# Altium schematic symbol library Sang_library.SchLib: 1607 symbols (part 10 of 15) (continued)
## PMEG4030EP,115
designator D?, comment 40V/3A
DIODE SCHOTTKY 40V 3A SOD128; MPN: PMEG4030EP,115; MFR: Nexperia USA Inc.; Solder: SMT; Value: 40V/3A; PinCount: 2
footprint SOD128 (SODFL, 2-Leads, Body 3.63x4.70mm, IPC Medium Density)
pins: 1 A, 2 K

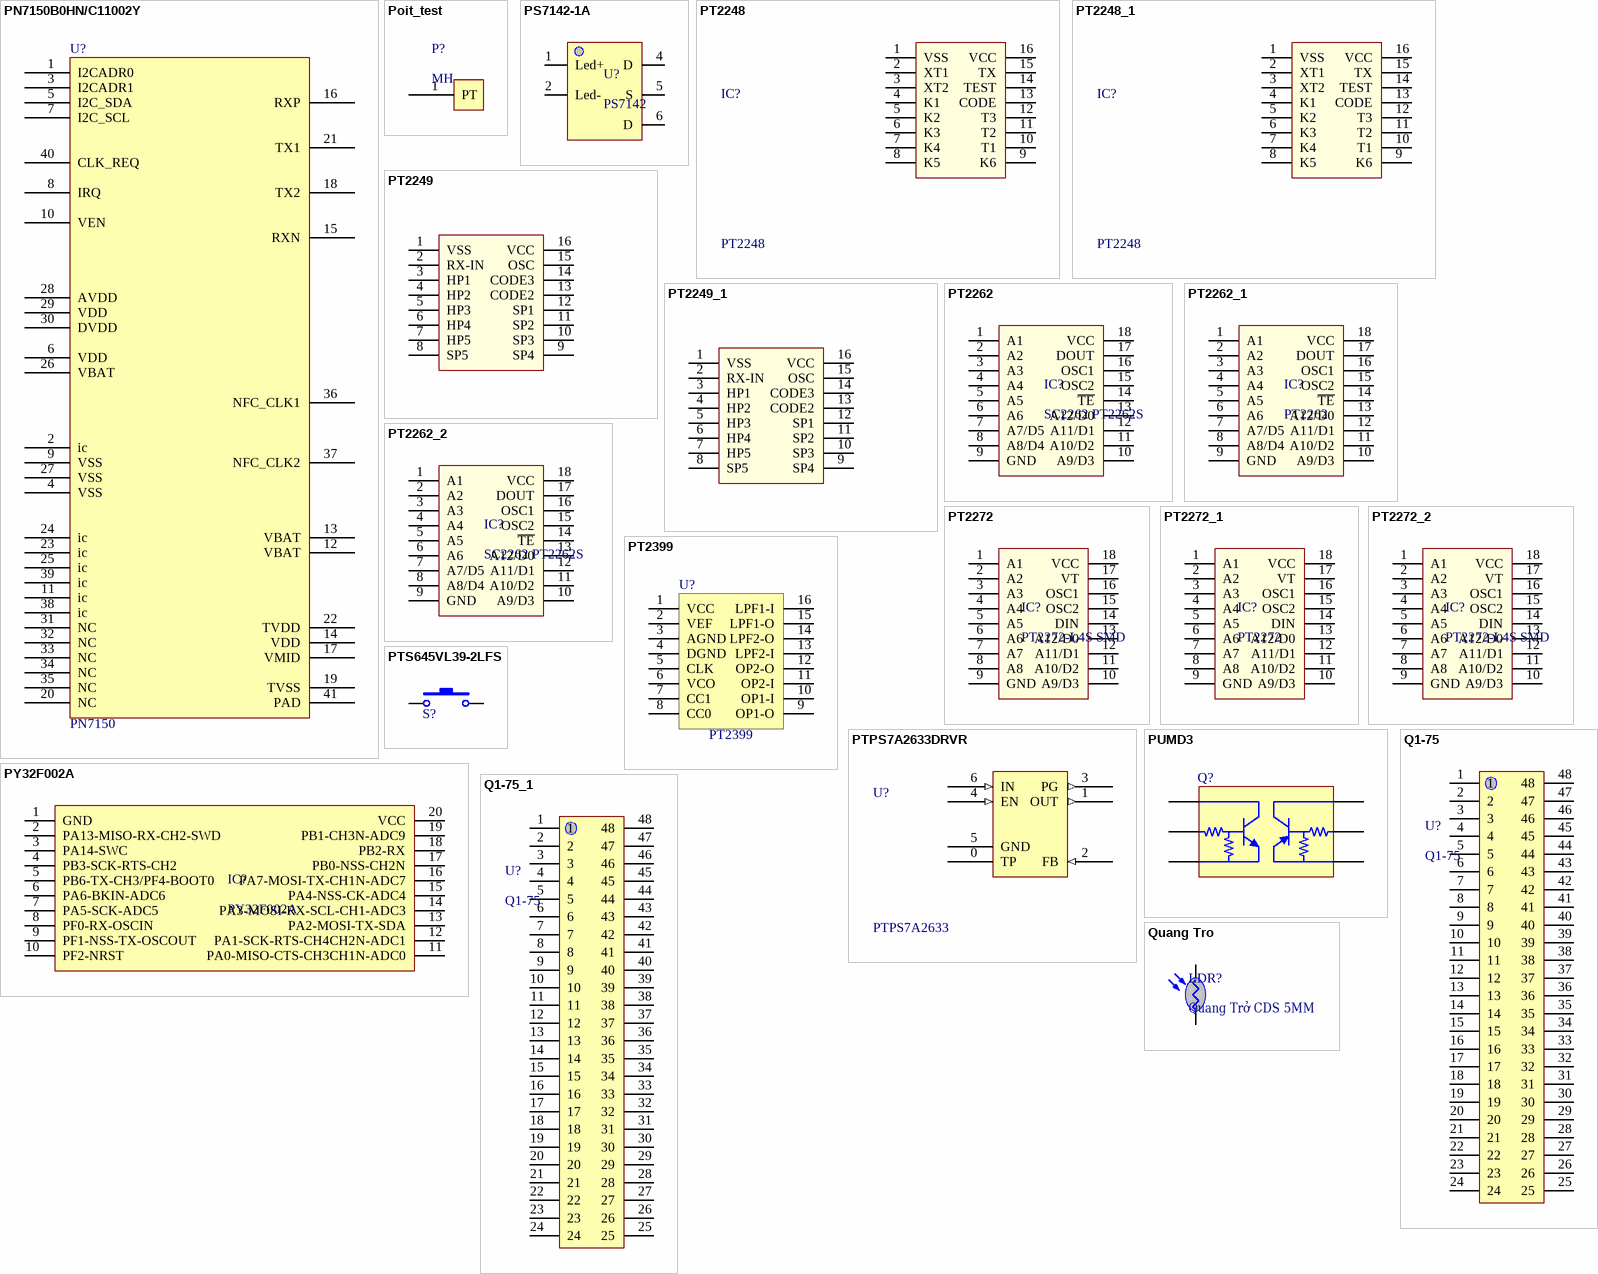
[diagram p62: symbols PN7150B0HN/C11002Y to Quang Tro]

## PN7150B0HN/C11002Y
designator U?, comment PN7150
RFID Reader IC 13.56MHz FeliCa, ISO 14443, MIFARE, NFC I²C, UART 2.3 V ~ 5.5 V 40-VFQFN Exposed Pad; MPN: PN7150B0HN/C11002Y; Solder: SMT; Value: PN7150; Category: IC
footprint VQFN-40
pins: 1 I2CADR0, 2 ic, 3 I2CADR1, 4 VSS, 5 I2C_SDA, 6 VDD, 7 I2C_SCL, 8 IRQ, 9 VSS, 10 VEN, 11 ic, 12 VBAT, 13 VBAT, 14 VDD, 15 RXN, 16 RXP, 17 VMID, 18 TX2, 19 TVSS, 20 NC, 21 TX1, 22 TVDD, 23 ic, 24 ic, 25 ic, 26 VBAT, 27 VSS, 28 AVDD, 29 VDD, 30 DVDD, 31 NC, 32 NC, 33 NC, 34 NC, 35 NC, 36 NFC_CLK1, 37 NFC_CLK2, 38 ic, 39 ic, 40 CLK_REQ, 41 PAD

## Poit_test
designator P?, comment MH
Cắm
pins: 1 PT

## PS7142-1A
designator U?, comment PS7142
footprint DIP6
pins: 1 Led+, 2 Led-, 3 NC hidden, 4 D, 5 S, 6 D

## PT2248
designator IC?
Cắm; Ten_Linh_Kien: PT2248 DIP16; Don_Vi: Con; Ma_Hang: MH002843; Ghi_Chu: *; Kieu_Chan: *; Chung_Loai: Cắm
footprint DIP16/W0.3 (16 PIN, W 300mil, Pin to pin 100mil)
pins: 1 VSS, 2 XT1, 3 XT2, 4 K1, 5 K2, 6 K3, 7 K4, 8 K5, 9 K6, 10 T1, 11 T2, 12 T3, 13 CODE, 14 TEST, 15 TX, 16 VCC

## PT2248_1
designator IC?, comment PT2248
Remote Control Tranmitter; Value: PT2248
footprint DIP16
footprint SO16L (SOIC, 16-Leads, Body 10.30x7.50mm, Pitch 1.27mm, IPC Medium Density)
pins: 1 VSS, 2 XT1, 3 XT2, 4 K1, 5 K2, 6 K3, 7 K4, 8 K5, 9 K6, 10 T1, 11 T2, 12 T3, 13 CODE, 14 TEST, 15 TX, 16 VCC

## PT2249
designator IC?, comment PT2249A
Cắm; Ten_Linh_Kien: PT2249A DIP16; Ma_Hang: MH002842; Don_Vi: Con; Ghi_Chu: *; Kieu_Chan: *; Chung_Loai: Cắm
footprint DIP16/W0.3 (16 PIN, W 300mil, Pin to pin 100mil)
pins: 1 VSS, 2 RX-IN, 3 HP1, 4 HP2, 5 HP3, 6 HP4, 7 HP5, 8 SP5, 9 SP4, 10 SP3, 11 SP2, 12 SP1, 13 CODE2, 14 CODE3, 15 OSC, 16 VCC

## PT2249_1
designator IC?, comment PT2249
Remote Control Receiver; Value: PT2249
footprint DIP16
footprint SO16L (SOIC, 16-Leads, Body 10.30x7.50mm, Pitch 1.27mm, IPC Medium Density)
pins: 1 VSS, 2 RX-IN, 3 HP1, 4 HP2, 5 HP3, 6 HP4, 7 HP5, 8 SP5, 9 SP4, 10 SP3, 11 SP2, 12 SP1, 13 CODE2, 14 CODE3, 15 OSC, 16 VCC

## PT2262
designator IC?, comment SC2262 PT2262S
Dán; Don_Vi: Con; Ma_Hang: MH000739; Ten_Linh_Kien: SC2262 PT2262S; Ghi_Chu: *; Kieu_Chan: *; Chung_Loai: Dán
footprint DIP18/W0.3 (18 PIN, W 300mil, Pin to pin 100mil)
pins: 1 A1, 2 A2, 3 A3, 4 A4, 5 A5, 6 A6, 7 A7/D5, 8 A8/D4, 9 GND, 10 A9/D3, 11 A10/D2, 12 A11/D1, 13 A12/D0, 14 ~{TE}, 15 OSC2, 16 OSC1, 17 DOUT, 18 VCC

## PT2262_1
designator IC?, comment PT2262
Remote Control Encoder
footprint DIP18 (DIP; 18 Leads; Row Spacing 7.62 mm; Pitch 2.54 mm)
footprint SO18 (SOIC, 18-Leads, Body 11.50x7.50mm, Pitch 1.27mm, IPC Medium Density)
pins: 1 A1, 2 A2, 3 A3, 4 A4, 5 A5, 6 A6, 7 A7/D5, 8 A8/D4, 9 GND, 10 A9/D3, 11 A10/D2, 12 A11/D1, 13 A12/D0, 14 ~{TE}, 15 OSC2, 16 OSC1, 17 DOUT, 18 VCC

## PT2262_2
designator IC?, comment SC2262 PT2262S
Dán; Don_Vi: Con; Ma_Hang: MH000739; Ten_Linh_Kien: SC2262 PT2262S; Ghi_Chu: *; Kieu_Chan: *; Chung_Loai: Dán
footprint DIP18/W0.3 (18 PIN, W 300mil, Pin to pin 100mil)
pins: 1 A1, 2 A2, 3 A3, 4 A4, 5 A5, 6 A6, 7 A7/D5, 8 A8/D4, 9 GND, 10 A9/D3, 11 A10/D2, 12 A11/D1, 13 A12/D0, 14 ~{TE}, 15 OSC2, 16 OSC1, 17 DOUT, 18 VCC

## PT2272
designator IC?, comment PT2272-L4S SMD
Dán; Don_Vi: Con; Ma_Hang: MH000736; Ten_Linh_Kien: PT2272-L4S SMD; Kieu _Chan: *; Ghi_Chu: *; Chung_Loai: Dán
footprint DIP18/W0.3 (18 PIN, W 300mil, Pin to pin 100mil)
pins: 1 A1, 2 A2, 3 A3, 4 A4, 5 A5, 6 A6, 7 A7, 8 A8, 9 GND, 10 A9/D3, 11 A10/D2, 12 A11/D1, 13 A12/D0, 14 DIN, 15 OSC2, 16 OSC1, 17 VT, 18 VCC

## PT2272_1
designator IC?, comment PT2272
Remote Control Decoder
footprint DIP18 (DIP; 18 Leads; Row Spacing 7.62 mm; Pitch 2.54 mm)
footprint SO18 (SOIC, 18-Leads, Body 11.50x7.50mm, Pitch 1.27mm, IPC Medium Density)
pins: 1 A1, 2 A2, 3 A3, 4 A4, 5 A5, 6 A6, 7 A7, 8 A8, 9 GND, 10 A9/D3, 11 A10/D2, 12 A11/D1, 13 A12/D0, 14 DIN, 15 OSC2, 16 OSC1, 17 VT, 18 VCC

## PT2272_2
designator IC?, comment PT2272-L4S SMD
Dán; Don_Vi: Con; Ma_Hang: MH000736; Ten_Linh_Kien: PT2272-L4S SMD; Kieu _Chan: *; Ghi_Chu: *; Chung_Loai: Dán
footprint DIP18/W0.3 (18 PIN, W 300mil, Pin to pin 100mil)
pins: 1 A1, 2 A2, 3 A3, 4 A4, 5 A5, 6 A6, 7 A7, 8 A8, 9 GND, 10 A9/D3, 11 A10/D2, 12 A11/D1, 13 A12/D0, 14 DIN, 15 OSC2, 16 OSC1, 17 VT, 18 VCC

## PT2399
designator U?
Reverb
footprint DIP16
footprint SO16L (SOIC, 16-Leads, Body 10.30x7.50mm, Pitch 1.27mm, IPC Medium Density)
pins: 1 VCC, 2 VEF, 3 AGND, 4 DGND, 5 CLK, 6 VCO, 7 CC1, 8 CC0, 9 OP1-O, 10 OP1-I, 11 OP2-I, 12 OP2-O, 13 LPF2-I, 14 LPF2-O, 15 LPF1-O, 16 LPF1-I

## PTPS7A2633DRVR
designator U?, comment PTPS7A2633
TPS7A26 500-mA, 18-V, ultra-low IQ, LDO 3.3V; MPN: PTPS7A2633DRVR; MFR: Texas Instruments; Solder: SMT; Value: PTPS7A2633; Category: IC; PinCount: 7
footprint WSON6-2x2 (Footprint not found)
pins: 0 TP, 1 OUT (out), 2 FB (in), 3 PG (out), 4 EN (in), 5 GND (power), 6 IN (in)

## PTS645VL39-2LFS
designator S?, comment SW  (value not drawn)
Switch; Value: BUTTON2; Solder: HAND
footprint PTS645VL39-2LFS (Length 7mm)
pins: 1, 2

## PUMD3
designator Q?
NPN/PNP Resistor-equipped Transistor; Published: 17-Sep-2003; LatestRevisionDate: 12-Dec-2006; LatestRevisionNote: IPC-7351 Footprint Added.; DatasheetVersion: 16-Feb-2001; PackageVersion: Feb-1997; PackageReference: SOT363; Publisher: Altium Limited; PackageDescription: 6-Pin SOT-363 Package 0.65 mm Pitch, 2.1 mm Lead Span; Code_JEITA: SC-88; Code_JEDEC: MO-203-AB; Code_IPC: SOT363-6; ComponentLink1Description: Manufacturer Link; ComponentLink1URL: http://www.semiconductors.philips.com/; ComponentLink2Description: Datasheet; ComponentLink2URL: http://www.semiconductors.philips.com/acrobat/datasheets/PEMD3_PIMD3_PUMD3_9.pdf
footprint SOT363 (SOT363, 6-Leads, Body 2x1.3mm, Pitch 0.65mm, Lead Span 2.1mm, IPC High Density)
pins: 1 E1, 2 B1, 3 C2, 4 E2, 5 B2, 6 C1

## PY32F002A
designator IC?
footprint TSSOP20 (TSSOP, 20-Leads, Body 6.50x4.40mm, Pitch 0.65mm, IPC High Density)
pins: 1 GND, 2 PA13-MISO-RX-CH2-SWD, 3 PA14-SWC, 4 PB3-SCK-RTS-CH2, 5 PB6-TX-CH3/PF4-BOOT0, 6 PA6-BKIN-ADC6, 7 PA5-SCK-ADC5, 8 PF0-RX-OSCIN, 9 PF1-NSS-TX-OSCOUT, 10 PF2-NRST, 11 PA0-MISO-CTS-CH3CH1N-ADC0, 12 PA1-SCK-RTS-CH4CH2N-ADC1, 13 PA2-MOSI-TX-SDA, 14 PA3-MOSI-RX-SCL-CH1-ADC3, 15 PA4-NSS-CK-ADC4, 16 PA7-MOSI-TX-CH1N-ADC7, 17 PB0-NSS-CH2N, 18 PB2-RX, 19 PB1-CH3N-ADC9, 20 VCC

## Q1-75
designator U?
pins: 1, 2, 3, 4, 5, 6, 7, 8, 9, 10, 11, 12, 13, 14, 15, 16, 17, 18, 19, 20, 21, 22, 23, 24, 25, 26, 27, 28, 29, 30, 31, 32, 33, 34, 35, 36, 37, 38, 39, 40, 41, 42, 43, 44, 45, 46, 47, 48

## Q1-75_1
designator U?, comment Q1-75
pins: 1, 2, 3, 4, 5, 6, 7, 8, 9, 10, 11, 12, 13, 14, 15, 16, 17, 18, 19, 20, 21, 22, 23, 24, 25, 26, 27, 28, 29, 30, 31, 32, 33, 34, 35, 36, 37, 38, 39, 40, 41, 42, 43, 44, 45, 46, 47, 48

## Quang Tro
designator LDR?, comment Quang Trở CDS 5MM
Cắm; Ten_Linh_Kien: Quang Trở CDS 5MM 5537; Don_Vi: Con; Ma_Hang: MH000544; Ghi_Chu: *; Kieu_Chan: *; Chung_Loai: Cắm
footprint CDS (Footprint not found)
pins: 1 A, 2 K

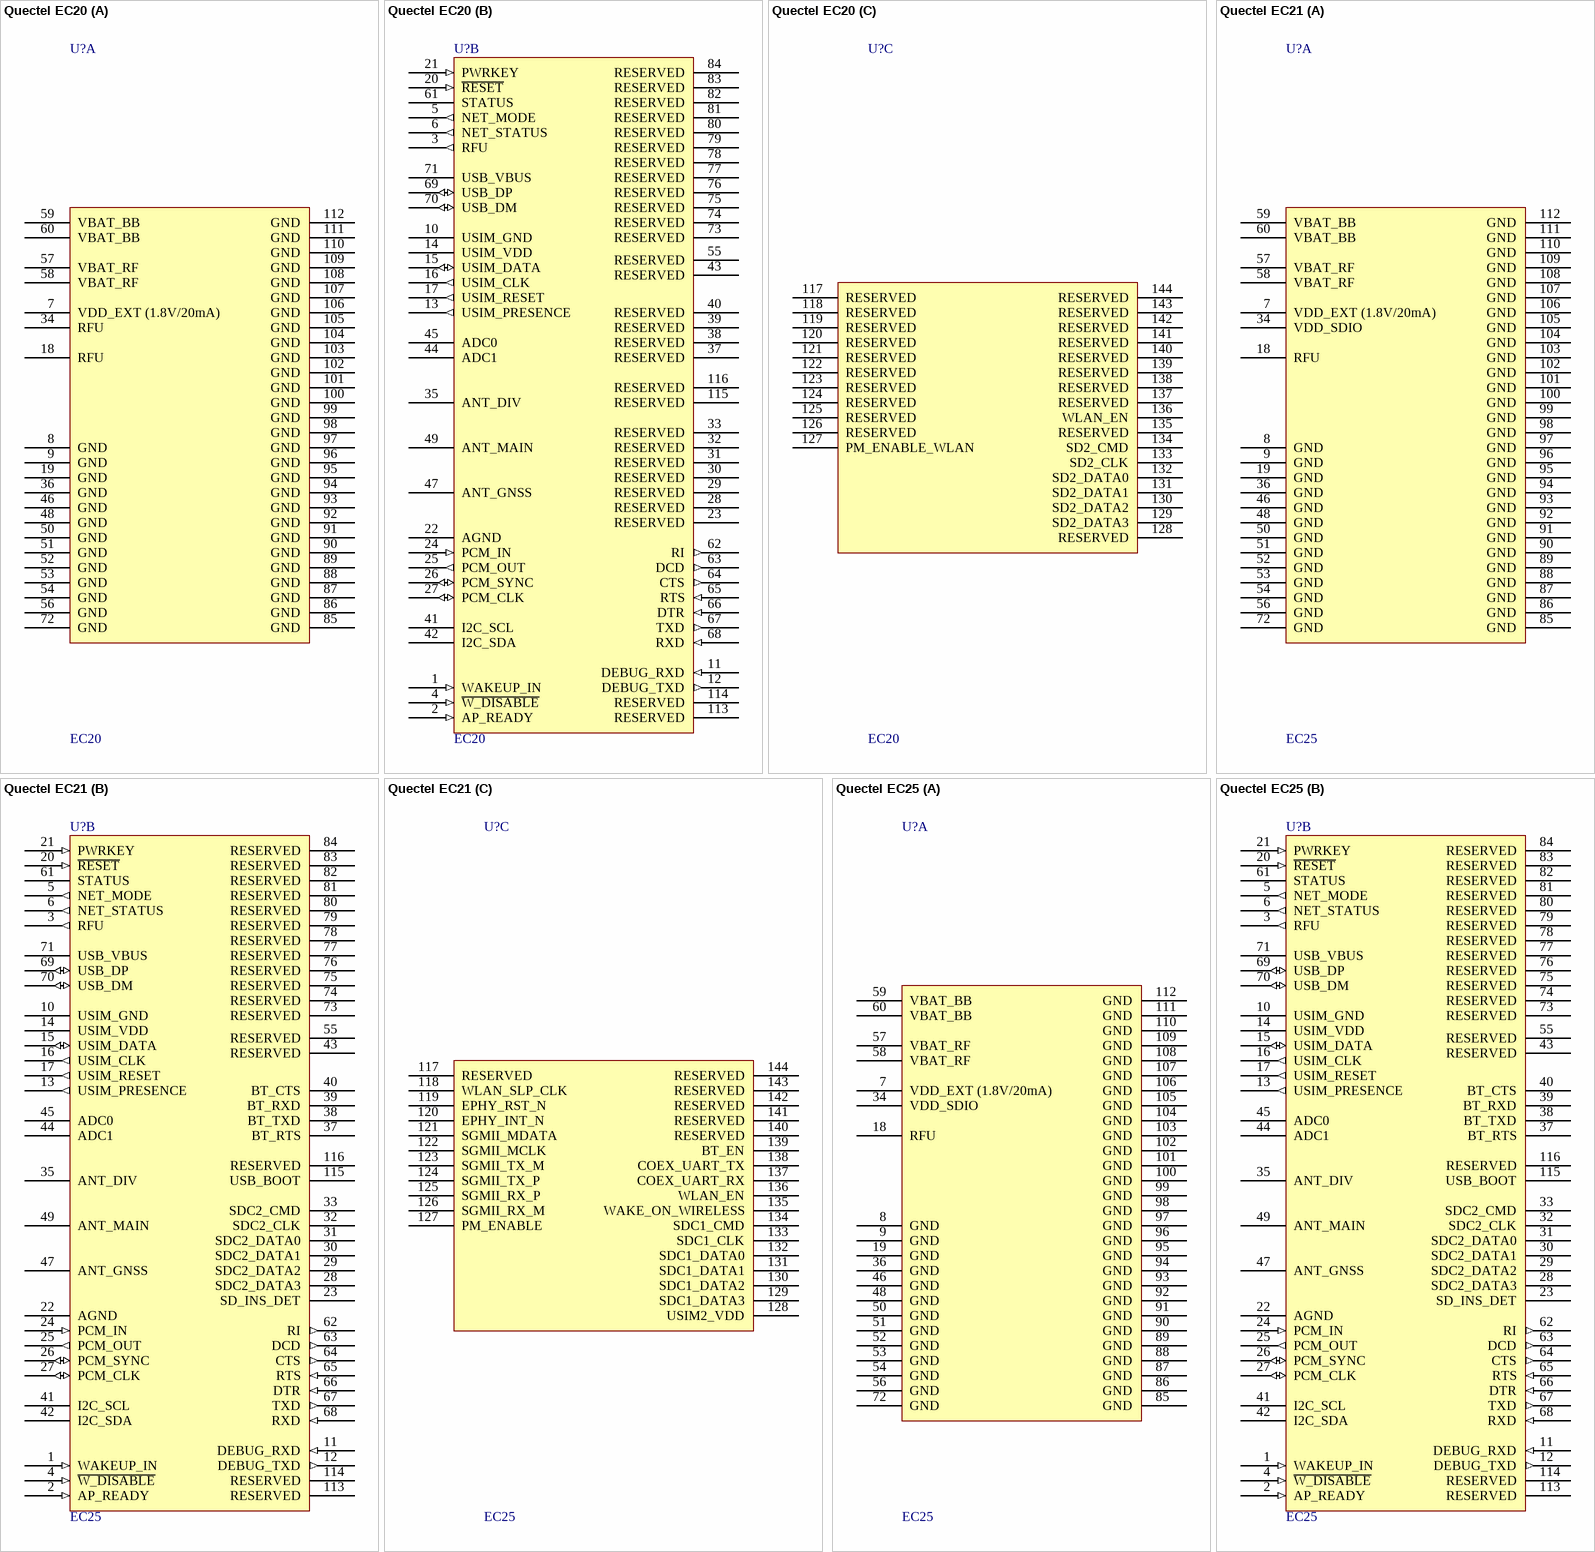
[diagram p63: symbols Quectel EC20 to Quectel EC25]

## Quectel EC20
designator U?, comment EC20
Value: EC20A; Solder: SMT; MPN: EC20A; Category: MODULE
footprint QUECTEL_EC25
part A pins: 7 VDD_EXT (1.8V/20mA) (power), 8 GND (power), 9 GND (power), 18 RFU (power), 19 GND (power), 34 RFU (power), 36 GND (power), 46 GND (power), 48 GND (power), 50 GND (power), 51 GND (power), 52 GND (power), 53 GND (power), 54 GND (power), 56 GND (power), 57 VBAT_RF (power), 58 VBAT_RF (power), 59 VBAT_BB (power), 60 VBAT_BB (power), 72 GND (power), 85 GND (power), 86 GND (power), 87 GND (power), 88 GND (power), 89 GND (power), 90 GND (power), 91 GND (power), 92 GND (power), 93 GND (power), 94 GND (power), 95 GND (power), 96 GND (power), 97 GND (power), 98 GND (power), 99 GND (power), 100 GND (power), 101 GND (power), 102 GND (power), 103 GND (power), 104 GND (power), 105 GND (power), 106 GND (power), 107 GND (power), 108 GND (power), 109 GND (power), 110 GND (power), 111 GND (power), 112 GND (power)
part B pins: 1 WAKEUP_IN (in), 2 AP_READY (in), 3 RFU (out), 4 ~{W_DISABLE} (in), 5 NET_MODE (out), 6 NET_STATUS (out), 10 USIM_GND (power), 11 DEBUG_RXD (in), 12 DEBUG_TXD (out), 13 USIM_PRESENCE (out), 14 USIM_VDD (power), 15 USIM_DATA (io), 16 USIM_CLK (out), 17 USIM_RESET (out), 20 ~{RESET} (in), 21 PWRKEY (in), 22 AGND (power), 23 RESERVED, 24 PCM_IN (in), 25 PCM_OUT (out), 26 PCM_SYNC (io), 27 PCM_CLK (io), 28 RESERVED, 29 RESERVED, 30 RESERVED, 31 RESERVED, 32 RESERVED, 33 RESERVED, 35 ANT_DIV, 37 RESERVED, 38 RESERVED, 39 RESERVED, 40 RESERVED, 41 I2C_SCL (oe), 42 I2C_SDA (oe), 43 RESERVED, 44 ADC1 (hiz) "0.2V-4.2V", 45 ADC0 (hiz) "0.2V-2.1V", 47 ANT_GNSS, 49 ANT_MAIN, 55 RESERVED, 61 STATUS (oe), 62 RI (out), 63 DCD (out), 64 CTS (out), 65 RTS (in), 66 DTR (in), 67 TXD (out), 68 RXD (in), 69 USB_DP (io), 70 USB_DM (io), 71 USB_VBUS (power), 73 RESERVED, 74 RESERVED, 75 RESERVED, 76 RESERVED, 77 RESERVED, 78 RESERVED, 79 RESERVED, 80 RESERVED, 81 RESERVED, 82 RESERVED, 83 RESERVED, 84 RESERVED, 113 RESERVED, 114 RESERVED, 115 RESERVED, 116 RESERVED
part C pins: 117 RESERVED, 118 RESERVED, 119 RESERVED, 120 RESERVED, 121 RESERVED, 122 RESERVED, 123 RESERVED, 124 RESERVED, 125 RESERVED, 126 RESERVED, 127 PM_ENABLE_WLAN, 128 RESERVED, 129 SD2_DATA3, 130 SD2_DATA2, 131 SD2_DATA1, 132 SD2_DATA0, 133 SD2_CLK, 134 SD2_CMD, 135 RESERVED, 136 WLAN_EN, 137 RESERVED, 138 RESERVED, 139 RESERVED, 140 RESERVED, 141 RESERVED, 142 RESERVED, 143 RESERVED, 144 RESERVED

## Quectel EC21
designator U?, comment EC25
MFR: Quectel; Value: EC21; Solder: SMT; MPN: EC21; Category: MODULE
footprint QUECTEL_EC21
part A pins: 7 VDD_EXT (1.8V/20mA) (power), 8 GND (power), 9 GND (power), 18 RFU (power), 19 GND (power), 34 VDD_SDIO (power), 36 GND (power), 46 GND (power), 48 GND (power), 50 GND (power), 51 GND (power), 52 GND (power), 53 GND (power), 54 GND (power), 56 GND (power), 57 VBAT_RF (power), 58 VBAT_RF (power), 59 VBAT_BB (power), 60 VBAT_BB (power), 72 GND (power), 85 GND (power), 86 GND (power), 87 GND (power), 88 GND (power), 89 GND (power), 90 GND (power), 91 GND (power), 92 GND (power), 93 GND (power), 94 GND (power), 95 GND (power), 96 GND (power), 97 GND (power), 98 GND (power), 99 GND (power), 100 GND (power), 101 GND (power), 102 GND (power), 103 GND (power), 104 GND (power), 105 GND (power), 106 GND (power), 107 GND (power), 108 GND (power), 109 GND (power), 110 GND (power), 111 GND (power), 112 GND (power)
part B pins: 1 WAKEUP_IN (in), 2 AP_READY (in), 3 RFU (out), 4 ~{W_DISABLE} (in), 5 NET_MODE (out), 6 NET_STATUS (out), 10 USIM_GND (power), 11 DEBUG_RXD (in), 12 DEBUG_TXD (out), 13 USIM_PRESENCE (out), 14 USIM_VDD (power), 15 USIM_DATA (io), 16 USIM_CLK (out), 17 USIM_RESET (out), 20 ~{RESET} (in), 21 PWRKEY (in), 22 AGND (power), 23 SD_INS_DET, 24 PCM_IN (in), 25 PCM_OUT (out), 26 PCM_SYNC (io), 27 PCM_CLK (io), 28 SDC2_DATA3, 29 SDC2_DATA2, 30 SDC2_DATA1, 31 SDC2_DATA0, 32 SDC2_CLK, 33 SDC2_CMD, 35 ANT_DIV, 37 BT_RTS, 38 BT_TXD, 39 BT_RXD, 40 BT_CTS, 41 I2C_SCL (oe), 42 I2C_SDA (oe), 43 RESERVED, 44 ADC1 (hiz) "0.2V-4.2V", 45 ADC0 (hiz) "0.2V-2.1V", 47 ANT_GNSS, 49 ANT_MAIN, 55 RESERVED, 61 STATUS (oe), 62 RI (out), 63 DCD (out), 64 CTS (out), 65 RTS (in), 66 DTR (in), 67 TXD (out), 68 RXD (in), 69 USB_DP (io), 70 USB_DM (io), 71 USB_VBUS (power), 73 RESERVED, 74 RESERVED, 75 RESERVED, 76 RESERVED, 77 RESERVED, 78 RESERVED, 79 RESERVED, 80 RESERVED, 81 RESERVED, 82 RESERVED, 83 RESERVED, 84 RESERVED, 113 RESERVED, 114 RESERVED, 115 USB_BOOT, 116 RESERVED
part C pins: 117 RESERVED, 118 WLAN_SLP_CLK, 119 EPHY_RST_N, 120 EPHY_INT_N, 121 SGMII_MDATA, 122 SGMII_MCLK, 123 SGMII_TX_M, 124 SGMII_TX_P, 125 SGMII_RX_P, 126 SGMII_RX_M, 127 PM_ENABLE, 128 USIM2_VDD, 129 SDC1_DATA3, 130 SDC1_DATA2, 131 SDC1_DATA1, 132 SDC1_DATA0, 133 SDC1_CLK, 134 SDC1_CMD, 135 WAKE_ON_WIRELESS, 136 WLAN_EN, 137 COEX_UART_RX, 138 COEX_UART_TX, 139 BT_EN, 140 RESERVED, 141 RESERVED, 142 RESERVED, 143 RESERVED, 144 RESERVED

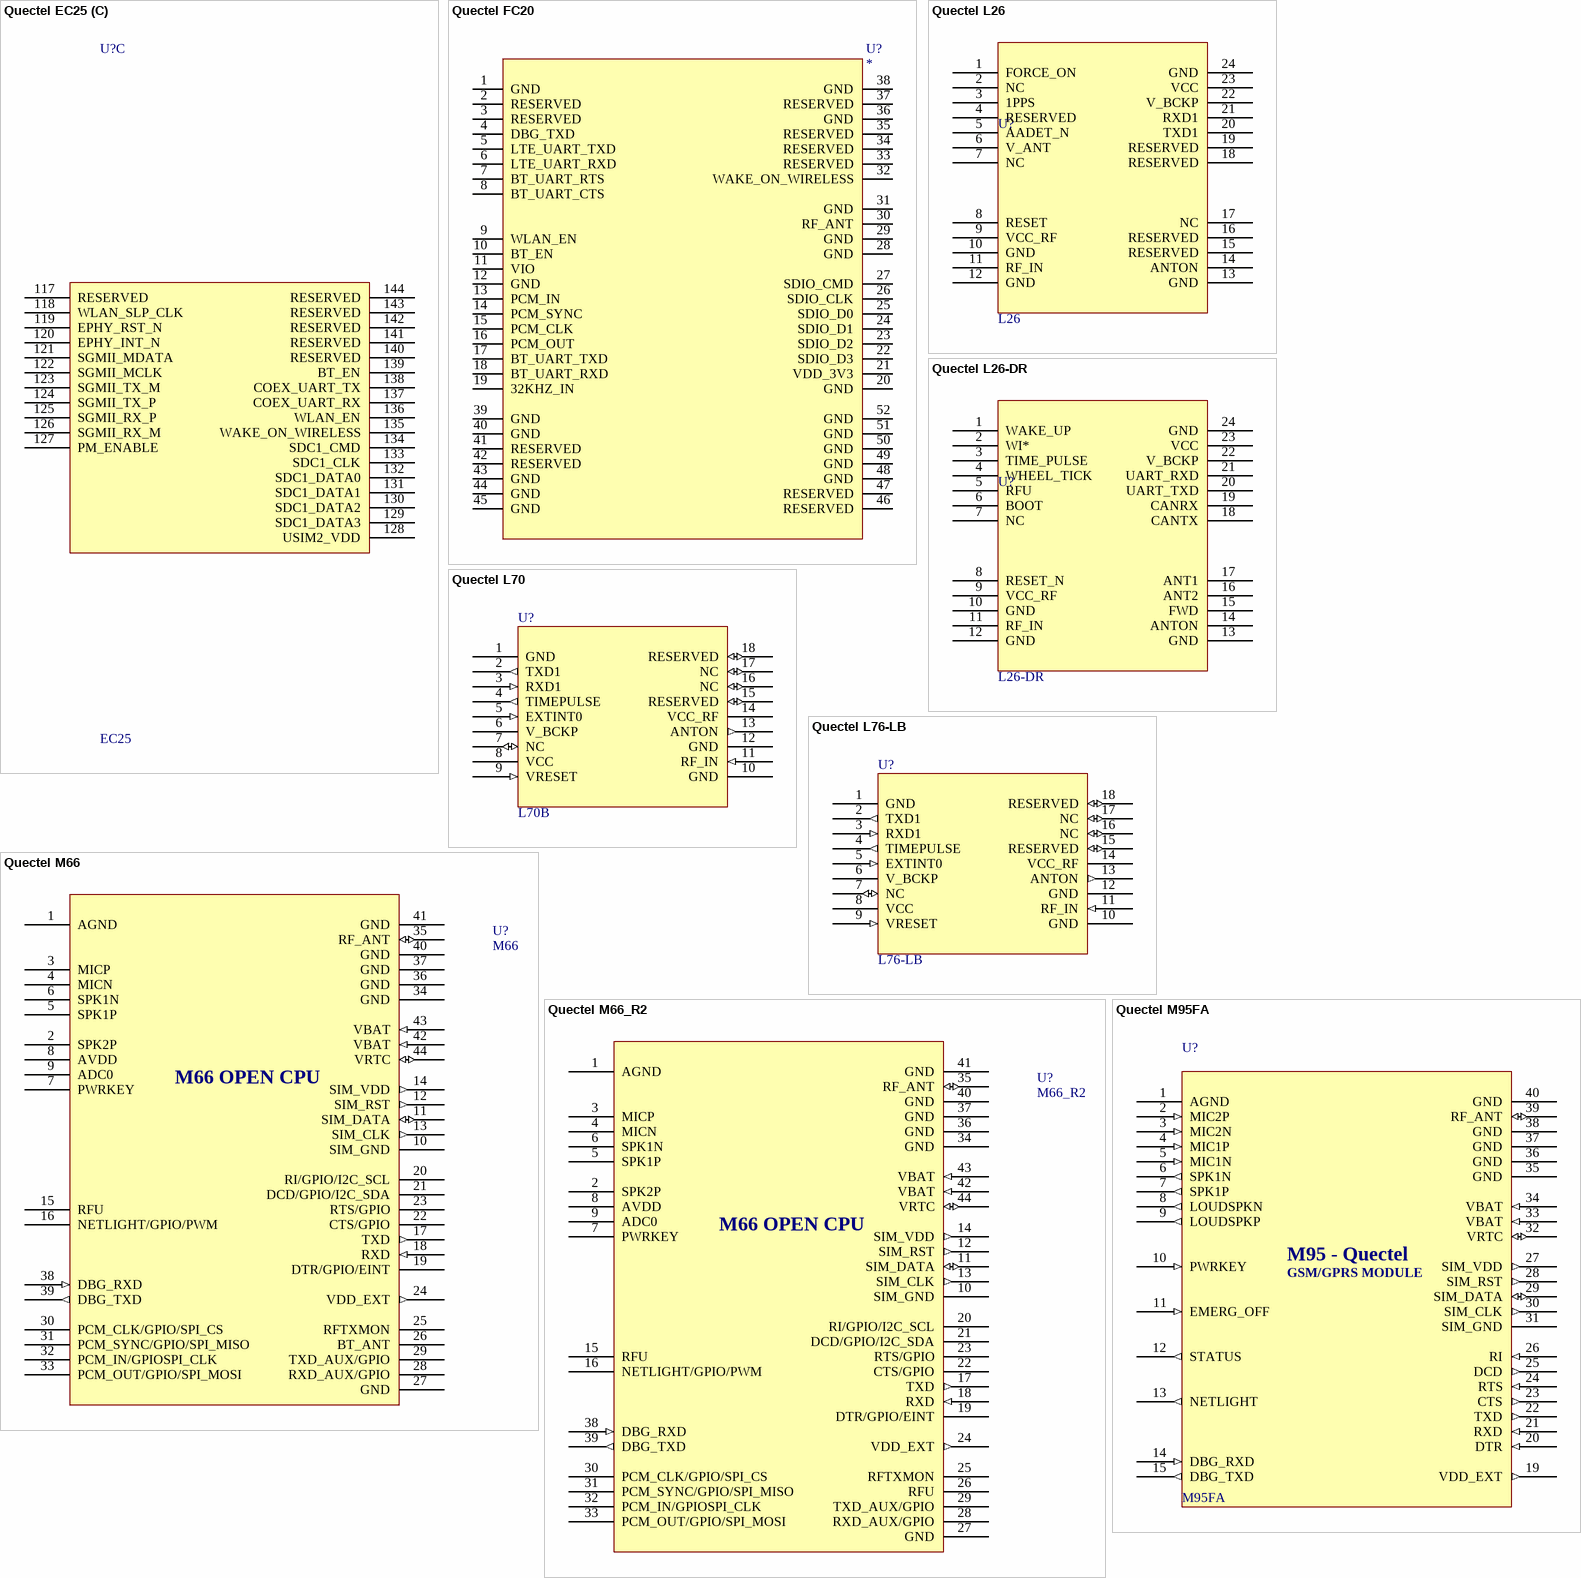
[diagram p64: symbols Quectel EC25 to Quectel M95FA]

## Quectel EC25
designator U?, comment EC25
MFR: Quectel; Value: EC25A; Solder: SMT; MPN: EC25A; Category: MODULE
footprint QUECTEL_EC25
part A pins: 7 VDD_EXT (1.8V/20mA) (power), 8 GND (power), 9 GND (power), 18 RFU (power), 19 GND (power), 34 VDD_SDIO (power), 36 GND (power), 46 GND (power), 48 GND (power), 50 GND (power), 51 GND (power), 52 GND (power), 53 GND (power), 54 GND (power), 56 GND (power), 57 VBAT_RF (power), 58 VBAT_RF (power), 59 VBAT_BB (power), 60 VBAT_BB (power), 72 GND (power), 85 GND (power), 86 GND (power), 87 GND (power), 88 GND (power), 89 GND (power), 90 GND (power), 91 GND (power), 92 GND (power), 93 GND (power), 94 GND (power), 95 GND (power), 96 GND (power), 97 GND (power), 98 GND (power), 99 GND (power), 100 GND (power), 101 GND (power), 102 GND (power), 103 GND (power), 104 GND (power), 105 GND (power), 106 GND (power), 107 GND (power), 108 GND (power), 109 GND (power), 110 GND (power), 111 GND (power), 112 GND (power)
part B pins: 1 WAKEUP_IN (in), 2 AP_READY (in), 3 RFU (out), 4 ~{W_DISABLE} (in), 5 NET_MODE (out), 6 NET_STATUS (out), 10 USIM_GND (power), 11 DEBUG_RXD (in), 12 DEBUG_TXD (out), 13 USIM_PRESENCE (out), 14 USIM_VDD (power), 15 USIM_DATA (io), 16 USIM_CLK (out), 17 USIM_RESET (out), 20 ~{RESET} (in), 21 PWRKEY (in), 22 AGND (power), 23 SD_INS_DET, 24 PCM_IN (in), 25 PCM_OUT (out), 26 PCM_SYNC (io), 27 PCM_CLK (io), 28 SDC2_DATA3, 29 SDC2_DATA2, 30 SDC2_DATA1, 31 SDC2_DATA0, 32 SDC2_CLK, 33 SDC2_CMD, 35 ANT_DIV, 37 BT_RTS, 38 BT_TXD, 39 BT_RXD, 40 BT_CTS, 41 I2C_SCL (oe), 42 I2C_SDA (oe), 43 RESERVED, 44 ADC1 (hiz) "0.2V-4.2V", 45 ADC0 (hiz) "0.2V-2.1V", 47 ANT_GNSS, 49 ANT_MAIN, 55 RESERVED, 61 STATUS (oe), 62 RI (out), 63 DCD (out), 64 CTS (out), 65 RTS (in), 66 DTR (in), 67 TXD (out), 68 RXD (in), 69 USB_DP (io), 70 USB_DM (io), 71 USB_VBUS (power), 73 RESERVED, 74 RESERVED, 75 RESERVED, 76 RESERVED, 77 RESERVED, 78 RESERVED, 79 RESERVED, 80 RESERVED, 81 RESERVED, 82 RESERVED, 83 RESERVED, 84 RESERVED, 113 RESERVED, 114 RESERVED, 115 USB_BOOT, 116 RESERVED
part C pins: 117 RESERVED, 118 WLAN_SLP_CLK, 119 EPHY_RST_N, 120 EPHY_INT_N, 121 SGMII_MDATA, 122 SGMII_MCLK, 123 SGMII_TX_M, 124 SGMII_TX_P, 125 SGMII_RX_P, 126 SGMII_RX_M, 127 PM_ENABLE, 128 USIM2_VDD, 129 SDC1_DATA3, 130 SDC1_DATA2, 131 SDC1_DATA1, 132 SDC1_DATA0, 133 SDC1_CLK, 134 SDC1_CMD, 135 WAKE_ON_WIRELESS, 136 WLAN_EN, 137 COEX_UART_RX, 138 COEX_UART_TX, 139 BT_EN, 140 RESERVED, 141 RESERVED, 142 RESERVED, 143 RESERVED, 144 RESERVED

## Quectel FC20
designator U?
MFR: Quectel; MPN: EFC20; Solder: SMT; Value: FC20; Part Description: *; PCB DECAL: *; Category: MODULE
footprint QUECTEL FC20 (Footprint not found)
pins: 1 GND, 2 RESERVED, 3 RESERVED, 4 DBG_TXD, 5 LTE_UART_TXD, 6 LTE_UART_RXD, 7 BT_UART_RTS, 8 BT_UART_CTS, 9 WLAN_EN, 10 BT_EN, 11 VIO, 12 GND, 13 PCM_IN, 14 PCM_SYNC, 15 PCM_CLK, 16 PCM_OUT, 17 BT_UART_TXD, 18 BT_UART_RXD, 19 32KHZ_IN, 20 GND, 21 VDD_3V3, 22 SDIO_D3, 23 SDIO_D2, 24 SDIO_D1, 25 SDIO_D0, 26 SDIO_CLK, 27 SDIO_CMD, 28 GND, 29 GND, 30 RF_ANT, 31 GND, 32 WAKE_ON_WIRELESS, 33 RESERVED, 34 RESERVED, 35 RESERVED, 36 GND, 37 RESERVED, 38 GND, 39 GND, 40 GND, 41 RESERVED, 42 RESERVED, 43 GND, 44 GND, 45 GND, 46 RESERVED, 47 RESERVED, 48 GND, 49 GND, 50 GND, 51 GND, 52 GND
2 alternate drawings of the same symbol

## Quectel L26
designator U?, comment L26
GNSS Module Quectel L26; Solder: SMT; Value: L26; MPN: L26; MFR: Quectel; Category: MODULE; PinCount: 24
footprint QUECTEL_L26 (Footprint not found)
pins: 1 FORCE_ON, 2 NC, 3 1PPS, 4 RESERVED, 5 AADET_N, 6 V_ANT, 7 NC, 8 RESET, 9 VCC_RF, 10 GND, 11 RF_IN, 12 GND, 13 GND, 14 ANTON, 15 RESERVED, 16 RESERVED, 17 NC, 18 RESERVED, 19 RESERVED, 20 TXD1, 21 RXD1, 22 V_BCKP, 23 VCC, 24 GND